# Altium footprint library Connectors.PcbLib: 14 footprints
Each footprint in its own frame and in the unit in brackets; x right, y up, seen from the top. Pads: shape width x height; smd on the part's side, far side on the other; paste and mask are expansions set on the pad; w line width, h text height; cw(c..) or ccw(c..) is an arc to the next point about the centre after c.
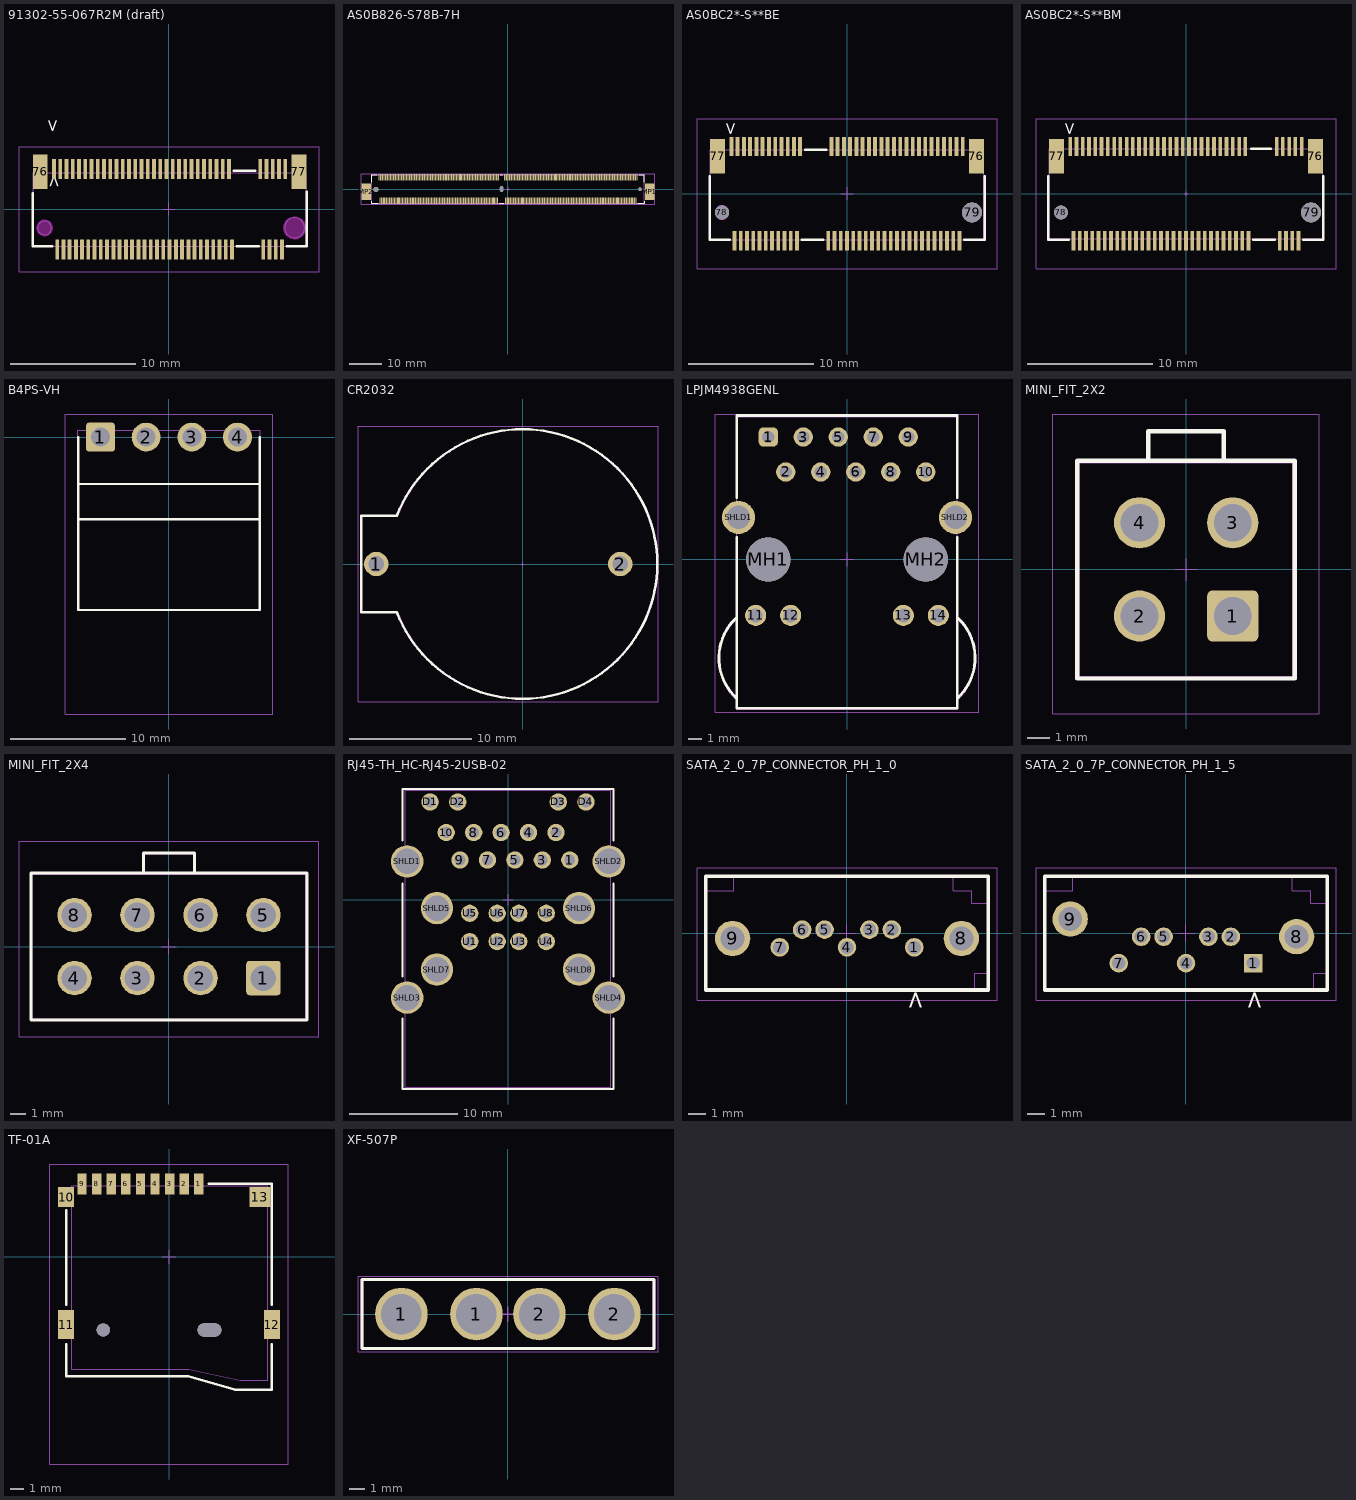
[diagram p0: the footprints below, top view; thin cyan lines are the x and y axes]

## 91302-55-067R2M (draft) [mil]
height 188.98
pads (69):
  rect 11.81x63 smd paste+0 mask+1.97: 1(-362.2,126.78) 2(-352.36,-127.16) 3(-342.52,126.78) 4(-332.67,-127.16) 5(-322.83,126.78) 6(-312.99,-127.16) 7(-303.15,126.78) 8(-293.3,-127.16) 9(-283.46,126.78) 10(-273.62,-127.16) 11(-263.78,126.78) 12(-253.94,-127.16) 13(-244.09,126.78) 14(-234.25,-127.16) 15(-224.41,126.78) 16(-214.57,-127.16) 17(-204.72,126.78) 18(-194.88,-127.16) 19(-185.04,126.78) 20(-175.19,-127.16) 21(-165.35,126.78) 22(-155.51,-127.16) 23(-145.67,126.78) 24(-135.82,-127.16) 25(-125.98,126.78) 26(-116.14,-127.16) 27(-106.3,126.78) 28(-96.45,-127.16) 29(-86.61,126.78) 30(-76.77,-127.16) 31(-66.93,126.78) 32(-57.09,-127.16) 33(-47.24,126.78) 34(-37.4,-127.16) 35(-27.56,126.78) 36(-17.72,-127.16) 37(-7.87,126.78) 38(1.97,-127.16) 39(11.81,126.78) 40(21.66,-127.16) 41(31.5,126.78) 42(41.34,-127.16) 43(51.18,126.78) 44(61.03,-127.16) 45(70.87,126.78) 46(80.71,-127.16) 47(90.55,126.78) 48(100.39,-127.16) 49(110.24,126.78) 50(120.08,-127.16) 51(129.92,126.78) 52(139.77,-127.16) 53(149.61,126.78) 54(159.45,-127.16) 55(169.29,126.78) 56(179.14,-127.16) 57(188.98,126.78) 58(198.82,-127.16) 67(297.24,-127.16) 68(287.4,126.78) 69(316.93,-127.16) 70(307.09,126.78) 71(336.61,-127.16) 72(326.77,126.78) 73(356.3,-127.16) 74(346.46,126.78) 75(366.14,126.78)
  rect 47.24x108.27 smd paste+0 mask+1.97: 76(-405.51,118.11) 77(409.45,118.11)
Top Overlay:
  lines w7.87: -428.74,49.81 -428.74,-117.12 -367.37,-117.12 ; 203.98,120.67 272.39,120.67 ; 213.82,-117.12 282.23,-117.12 ; 371.3,-117.12 433.46,-117.12 433.46,54.89
  text ">" at -383.84,284.46 h39.37
  text ">" at -344.49,65.94 h39.37
Keep-Out Layer:
  board cut-out: -370.08,-59.05 -370.08,-54.74 -373.38,-46.79 -379.47,-40.7 -387.43,-37.4 -396.04,-37.4 -404,-40.7 -410.09,-46.79 -413.38,-54.74 -413.38,-59.05 -413.38,-63.36 -410.09,-71.31 -404,-77.4 -396.04,-80.7 -387.43,-80.7 -379.47,-77.4 -373.38,-71.31 -370.08,-63.36
  board cut-out: 427.17,-59.05 427.17,-54.9 425.02,-46.89 420.87,-39.71 415.01,-33.84 407.83,-29.7 399.81,-27.55 391.52,-27.55 383.51,-29.7 376.33,-33.84 370.46,-39.71 366.31,-46.89 364.17,-54.9 364.17,-59.05 364.17,-63.2 366.31,-71.21 370.46,-78.39 376.33,-84.26 383.51,-88.4 391.52,-90.55 399.82,-90.55 407.83,-88.4 415.01,-84.26 420.87,-78.39 425.02,-71.21 427.17,-63.2
Keep-Out Layer:
  circle w10: c-391.73,-59.05 r21.65
  circle w1: c-391.73,-59.05 r21.65
  circle w10: c395.67,-59.05 r31.5
  circle w1: c395.67,-59.05 r31.5
Top Assembly:
  circle w1: c-391.73,-59.05 r21.65
  circle w1: c395.67,-59.05 r31.5
Top Courtyard:
  lines w1.97: -472.44,-196.85 472.45,-196.85 472.45,196.86 -472.44,196.86 -472.44,-196.85 ; -428.15,-117.12 432.09,-117.12 432.09,115.16 -428.15,115.16 -428.15,-117.12
Top Component Center:
  lines w1.97: -19.68,0 19.68,0 ; 0,-19.68 0,19.68
3D body "91302-55-067rde.stp": height 218.5, standoff -17.72, extent -430.12,-140.75 430.12,139.57

## AS0B826-S78B-7H [mm] "314pin MXM3.0 CONNECTOR"
height 7.8
pads (319):
  round 1.1 hole 1.1 unplated mask+0.05: MH1(41,-0.125)
  round 1.6 hole 1.6 unplated mask+0.05: MH2(-41,-0.125)
  oval 1x1.8 hole 1 slot 1.8 at 90 deg unplated mask+0.05: MH3(-2,0)
  rect 3x5.15 smd mask+0.05: MP1(44,-0.875) MP2(-44,-0.875)
  rect 0.35x2 smd mask+0.05: P1(-39.75,-3.625) P2(-39.25,-3.625) P3(-38.75,-3.625) P4(-38.25,-3.625) P5(-37.75,-3.625) P6(-37.25,-3.625) P7(-36.75,-3.625) P8(-36.25,-3.625) P9(-35.75,-3.625) P10(-35.25,-3.625) P11(-34.75,-3.625) P12(-34.25,-3.625) P13(-33.75,-3.625) P14(-33.25,-3.625) P15(-32.75,-3.625) P16(-32.25,-3.625) P17(-31.75,-3.625) P18(-31.25,-3.625) P19(-30.75,-3.625) P20(-30.25,-3.625) P21(-29.75,-3.625) P22(-29.25,-3.625) P23(-28.75,-3.625) P24(-28.25,-3.625) P25(-27.75,-3.625) P26(-27.25,-3.625) P27(-26.75,-3.625) P28(-26.25,-3.625) P29(-25.75,-3.625) P30(-25.25,-3.625) P31(-24.75,-3.625) P32(-24.25,-3.625) P33(-23.75,-3.625) P34(-23.25,-3.625) P35(-22.75,-3.625) P36(-22.25,-3.625) P37(-21.75,-3.625) P38(-21.25,-3.625) P39(-20.75,-3.625) P40(-20.25,-3.625) P41(-19.75,-3.625) P42(-19.25,-3.625) P43(-18.75,-3.625) P44(-18.25,-3.625) P45(-17.75,-3.625) P46(-17.25,-3.625) P47(-16.75,-3.625) P48(-16.25,-3.625) P49(-15.75,-3.625) P50(-15.25,-3.625) P51(-14.75,-3.625) P52(-14.25,-3.625) P53(-13.75,-3.625) P54(-13.25,-3.625) P55(-12.75,-3.625) P56(-12.25,-3.625) P57(-11.75,-3.625) P58(-11.25,-3.625) P59(-10.75,-3.625) P60(-10.25,-3.625) P61(-9.75,-3.625) P62(-9.25,-3.625) P63(-8.75,-3.625) P64(-8.25,-3.625) P65(-7.75,-3.625) P66(-7.25,-3.625) P67(-6.75,-3.625) P68(-6.25,-3.625) P69(-5.75,-3.625) P70(-5.25,-3.625) P71(-4.75,-3.625) P72(-4.25,-3.625) P73(-3.75,-3.625) P74(-3.25,-3.625) P75(-0.75,-3.625) P76(-0.25,-3.625) P77(0.25,-3.625) P78(0.75,-3.625) P79(1.25,-3.625) P80(1.75,-3.625) P81(2.25,-3.625) P82(2.75,-3.625) P83(3.25,-3.625) P84(3.75,-3.625) P85(4.25,-3.625) P86(4.75,-3.625) P87(5.25,-3.625) P88(5.75,-3.625) P89(6.25,-3.625) P90(6.75,-3.625) P91(7.25,-3.625) P92(7.75,-3.625) P93(8.25,-3.625) P94(8.75,-3.625) P95(9.25,-3.625) P96(9.75,-3.625) P97(10.25,-3.625) P98(10.75,-3.625) P99(11.25,-3.625) P100(11.75,-3.625) P101(12.25,-3.625) P102(12.75,-3.625) P103(13.25,-3.625) P104(13.75,-3.625) P105(14.25,-3.625) P106(14.75,-3.625) P107(15.25,-3.625) P108(15.75,-3.625) P109(16.25,-3.625) P110(16.75,-3.625) P111(17.25,-3.625) P112(17.75,-3.625) P113(18.25,-3.625) P114(18.75,-3.625) P115(19.25,-3.625) P116(19.75,-3.625) P117(20.25,-3.625) P118(20.75,-3.625) P119(21.25,-3.625) P120(21.75,-3.625) P121(22.25,-3.625) P122(22.75,-3.625) P123(23.25,-3.625) P124(23.75,-3.625) P125(24.25,-3.625) P126(24.75,-3.625) P127(25.25,-3.625) P128(25.75,-3.625) P129(26.25,-3.625) P130(26.75,-3.625) P131(27.25,-3.625) P132(27.75,-3.625) P133(28.25,-3.625) P134(28.75,-3.625) P135(29.25,-3.625) P136(29.75,-3.625) P137(30.25,-3.625) P138(30.75,-3.625) P139(31.25,-3.625) P140(31.75,-3.625) P141(32.25,-3.625) P142(32.75,-3.625) P143(33.25,-3.625) P144(33.75,-3.625) P145(34.25,-3.625) P146(34.75,-3.625) P147(35.25,-3.625) P148(35.75,-3.625) P149(36.25,-3.625) P150(36.75,-3.625) P151(37.25,-3.625) P152(37.75,-3.625) P153(38.25,-3.625) P154(38.75,-3.625) P155(39.25,-3.625) P156(39.75,-3.625) S1(-40,3.625) S2(-39.5,3.625) S3(-39,3.625) S4(-38.5,3.625) S5(-38,3.625) S6(-37.5,3.625) S7(-37,3.625) S8(-36.5,3.625) S9(-36,3.625) S10(-35.5,3.625) S11(-35,3.625) S12(-34.5,3.625) S13(-34,3.625) S14(-33.5,3.625) S15(-33,3.625) S16(-32.5,3.625) S17(-32,3.625) S18(-31.5,3.625) S19(-31,3.625) S20(-30.5,3.625) S21(-30,3.625) S22(-29.5,3.625) S23(-29,3.625) S24(-28.5,3.625) S25(-28,3.625) S26(-27.5,3.625) S27(-27,3.625) S28(-26.5,3.625) S29(-26,3.625) S30(-25.5,3.625) S31(-25,3.625) S32(-24.5,3.625) S33(-24,3.625) S34(-23.5,3.625) S35(-23,3.625) S36(-22.5,3.625) S37(-22,3.625) S38(-21.5,3.625) S39(-21,3.625) S40(-20.5,3.625) S41(-20,3.625) S42(-19.5,3.625) S43(-19,3.625) S44(-18.5,3.625) S45(-18,3.625) S46(-17.5,3.625) S47(-17,3.625) S48(-16.5,3.625) S49(-16,3.625) S50(-15.5,3.625) S51(-15,3.625) S52(-14.5,3.625) S53(-14,3.625) S54(-13.5,3.625) S55(-13,3.625) S56(-12.5,3.625) S57(-12,3.625) S58(-11.5,3.625) S59(-11,3.625) S60(-10.5,3.625) S61(-10,3.625) S62(-9.5,3.625) S63(-9,3.625) S64(-8.5,3.625) S65(-8,3.625) S66(-7.5,3.625) S67(-7,3.625) S68(-6.5,3.625) S69(-6,3.625) S70(-5.5,3.625) S71(-5,3.625) S72(-4.5,3.625) S73(-4,3.625) S74(-3.5,3.625) S75(-3,3.625) S76(-1,3.625) S77(-0.5,3.625) S78(0,3.625) S79(0.5,3.625) S80(1,3.625) S81(1.5,3.625) S82(2,3.625) S83(2.5,3.625) S84(3,3.625) S85(3.5,3.625) S86(4,3.625) S87(4.5,3.625) S88(5,3.625) S89(5.5,3.625) S90(6,3.625) S91(6.5,3.625) S92(7,3.625) S93(7.5,3.625) S94(8,3.625) S95(8.5,3.625) S96(9,3.625) S97(9.5,3.625) S98(10,3.625) S99(10.5,3.625) S100(11,3.625) S101(11.5,3.625) S102(12,3.625) S103(12.5,3.625) S104(13,3.625) S105(13.5,3.625) S106(14,3.625) S107(14.5,3.625) S108(15,3.625) S109(15.5,3.625) S110(16,3.625) S111(16.5,3.625) S112(17,3.625) S113(17.5,3.625) S114(18,3.625) S115(18.5,3.625) S116(19,3.625) S117(19.5,3.625) S118(20,3.625) S119(20.5,3.625) S120(21,3.625) S121(21.5,3.625) S122(22,3.625) S123(22.5,3.625) S124(23,3.625) S125(23.5,3.625) S126(24,3.625) S127(24.5,3.625) S128(25,3.625) S129(25.5,3.625) S130(26,3.625) S131(26.5,3.625) S132(27,3.625) S133(27.5,3.625) S134(28,3.625) S135(28.5,3.625) S136(29,3.625) S137(29.5,3.625) S138(30,3.625) S139(30.5,3.625) S140(31,3.625) S141(31.5,3.625) S142(32,3.625) S143(32.5,3.625) S144(33,3.625) S145(33.5,3.625) S146(34,3.625) S147(34.5,3.625) S148(35,3.625) S149(35.5,3.625) S150(36,3.625) S151(36.5,3.625) S152(37,3.625) S153(37.5,3.625) S154(38,3.625) S155(38.5,3.625) S156(39,3.625) S157(39.5,3.625) S158(40,3.625)
Top Overlay:
  lines w0.2: -42.3,-3.8 -42.3,-4.45 -40.31,-4.45 ; -42.3,2.05 -42.3,4.45 -40.56,4.45 ; -2.675,-4.45 -1.325,-4.45 ; -2.425,4.45 -1.575,4.45 ; 40.31,-4.45 42.3,-4.45 42.3,-3.8 ; 40.56,4.45 42.3,4.45 42.3,2.05
Top Assembly:
  lines w0.05: -42.3,-4.45 -42.3,4.45 42.3,4.45 42.3,-4.45 -42.3,-4.45
Top Courtyard:
  lines w0.05: -45.6,-4.725 45.6,-4.725 45.6,4.725 -45.6,4.725 -45.6,-4.725
Top Component Center:
  lines w0.05: -0.5,0 0.5,0 ; 0,-0.5 0,0.5
3D body "Foxconn_AS0B821-S78B-7H_AS0B826-S78B-7H_AS0B821-S78B-1H_AS0B826-S78B-1H_317-0000-1969_MXM_Socket.STEP": height 7.8, standoff -1.4, extent -44.4,-4.45 44.5,4.45

## AS0BC2*-S**BE [mm]
pads (71):
  rect 0.3x1.55 smd paste+0 mask+0.05: 1(-9.25,3.775) 2(-9,-3.775) 3(-8.75,3.775) 4(-8.5,-3.775) 5(-8.25,3.775) 6(-8,-3.775) 7(-7.75,3.775) 8(-7.5,-3.775) 9(-7.25,3.775) 10(-7,-3.775) 11(-6.75,3.775) 12(-6.5,-3.775) 13(-6.25,3.775) 14(-6,-3.775) 15(-5.75,3.775) 16(-5.5,-3.775) 17(-5.25,3.775) 18(-5,-3.775) 19(-4.75,3.775) 20(-4.5,-3.775) 21(-4.25,3.775) 22(-4,-3.775) 23(-3.75,3.775) 32(-1.5,-3.775) 33(-1.25,3.775) 34(-1,-3.775) 35(-0.75,3.775) 36(-0.5,-3.775) 37(-0.25,3.775) 38(0,-3.775) 39(0.25,3.775) 40(0.5,-3.775) 41(0.75,3.775) 42(1,-3.775) 43(1.25,3.775) 44(1.5,-3.775) 45(1.75,3.775) 46(2,-3.775) 47(2.25,3.775) 48(2.5,-3.775) 49(2.75,3.775) 50(3,-3.775) 51(3.25,3.775) 52(3.5,-3.775) 53(3.75,3.775) 54(4,-3.775) 55(4.25,3.775) 56(4.5,-3.775) 57(4.75,3.775) 58(5,-3.775) 59(5.25,3.775) 60(5.5,-3.775) 61(5.75,3.775) 62(6,-3.775) 63(6.25,3.775) 64(6.5,-3.775) 65(6.75,3.775) 66(7,-3.775) 67(7.25,3.775) 68(7.5,-3.775) 69(7.75,3.775) 70(8,-3.775) 71(8.25,3.775) 72(8.5,-3.775) 73(8.75,3.775) 74(9,-3.775) 75(9.25,3.775)
  rect 1.2x2.75 smd paste+0 mask+0.05: 76(10.35,3) 77(-10.35,3)
  round 1.1 hole 1.1 unplated mask+0.05: 78(-10,-1.5)
  round 1.6 hole 1.6 unplated mask+0.05: 79(10,-1.5)
Top Overlay:
  lines w0.2: -11,1.399 -11,-3.67 -9.381,-3.67 ; -3.619,-3.67 -1.881,-3.67 ; -3.35,3.525 -1.65,3.525 ; 9.381,-3.67 11,-3.67 11,1.399
  text ">" at -9.75,5.75 h1
Top Assembly:
  circle w0.025: c-10,-1.5 r0.55
  lines w0.05: -10.95,-3.67 10.95,-3.67 10.95,3.53 -10.95,3.53 -10.95,-3.67
Top Courtyard:
  lines w0.1: -12,-6 12,-6 12,6 -12,6 -12,-6
Top Component Center:
  lines w0.05: -0.5,0 0.5,0 ; 0,-0.5 0,0.5
3D body "91302-55-067rde.stp": height 5.45, standoff -0.55, extent -10.925,-3.35 10.925,3.77

## AS0BC2*-S**BM [mm]
pads (71):
  rect 0.3x1.55 smd paste+0 mask+0.05: 1(-9.25,3.775) 2(-9,-3.775) 3(-8.75,3.775) 4(-8.5,-3.775) 5(-8.25,3.775) 6(-8,-3.775) 7(-7.75,3.775) 8(-7.5,-3.775) 9(-7.25,3.775) 10(-7,-3.775) 11(-6.75,3.775) 12(-6.5,-3.775) 13(-6.25,3.775) 14(-6,-3.775) 15(-5.75,3.775) 16(-5.5,-3.775) 17(-5.25,3.775) 18(-5,-3.775) 19(-4.75,3.775) 20(-4.5,-3.775) 21(-4.25,3.775) 22(-4,-3.775) 23(-3.75,3.775) 24(-3.5,-3.775) 25(-3.25,3.775) 26(-3,-3.775) 27(-2.75,3.775) 28(-2.5,-3.775) 29(-2.25,3.775) 30(-2,-3.775) 31(-1.75,3.775) 32(-1.5,-3.775) 33(-1.25,3.775) 34(-1,-3.775) 35(-0.75,3.775) 36(-0.5,-3.775) 37(-0.25,3.775) 38(0,-3.775) 39(0.25,3.775) 40(0.5,-3.775) 41(0.75,3.775) 42(1,-3.775) 43(1.25,3.775) 44(1.5,-3.775) 45(1.75,3.775) 46(2,-3.775) 47(2.25,3.775) 48(2.5,-3.775) 49(2.75,3.775) 50(3,-3.775) 51(3.25,3.775) 52(3.5,-3.775) 53(3.75,3.775) 54(4,-3.775) 55(4.25,3.775) 56(4.5,-3.775) 57(4.75,3.775) 58(5,-3.775) 67(7.25,3.775) 68(7.5,-3.775) 69(7.75,3.775) 70(8,-3.775) 71(8.25,3.775) 72(8.5,-3.775) 73(8.75,3.775) 74(9,-3.775) 75(9.25,3.775)
  rect 1.2x2.75 smd paste+0 mask+0.05: 76(10.35,3) 77(-10.35,3)
  round 1.1 hole 1.1 unplated mask+0.05: 78(-10,-1.5)
  round 1.6 hole 1.6 unplated mask+0.05: 79(10,-1.5)
Top Overlay:
  lines w0.2: -11,1.399 -11,-3.67 -9.381,-3.67 ; 5.2,3.6 6.8,3.6 ; 5.381,-3.67 7.119,-3.67 ; 9.381,-3.67 11,-3.67 11,1.399
  text ">" at -9.75,5.75 h1
Top Assembly:
  lines w0.05: -10.95,-3.6 10.95,-3.6 10.95,3.6 -10.95,3.6 -10.95,-3.6
Top Courtyard:
  lines w0.1: -12,-6 12,-6 12,6 -12,6 -12,-6
Top Component Center:
  lines w0.05: -0.15,0 0.15,0 ; 0,-0.15 0,0.15
3D body "91302-42-067r2m.stp": height 3.95, standoff -0.75, extent -10.925,-4.3 10.925,4.103

## B4PS-VH [mm]
pads (4):
  rrect20% 2.5x2.5 hole 1.65 paste-2539.97 mask+0.05: 1(-5.94,0)
  round 2.5 hole 1.65 copper offset 0,0 paste-2539.97 mask+0.05: 2(-1.981,0) 3(1.98,0) 4(5.94,0)
Top Overlay:
  lines w0.2: -7.874,-7.112 7.874,-7.112 ; -7.874,-4.064 7.874,-4.064 ; -7.874,0 -7.874,-14.986 7.874,-14.986 7.874,0
Top Assembly:
  lines w0.05: -7.9,-15 -7.9,0.6 7.9,0.6 7.9,-15 -7.9,-15
Top Courtyard:
  lines w0.05: -9,-24 9,-24 9,2 -9,2 -9,-24
Top Component Center:
  lines w0.05: -0.15,0 0.15,0 ; 0,-0.15 0,0.15
3D body "B4PS-VH.stp": height 8.5, standoff -3.6, extent -7.89,-14.9 7.89,0.57

## CR2032 [mm] "KLS5-CR2032-01 (BH-642) (CH224-2032)"
pads (2):
  round 2 hole 1.3 mask+0.05: 1(-12,0) 2(8,0)
Top Overlay:
  lines w0.2: -10.321,-3.95 -13.25,-3.95 -13.25,3.95 -10.321,3.95 ; -10.321,-3.948 ccw(c0,0) -10.321,3.948
Top Assembly:
  lines w0.05: -13.2,-3.93 -10.274,-3.93 ccw(c0,0) -10.274,3.93 -13.2,3.93 -13.2,-3.93
Top Courtyard:
  lines w0.05: -13.5,-11.3 11.1,-11.3 11.1,11.3 -13.5,11.3 -13.5,-11.3
Top Component Center:
  lines w0.05: -0.15,0 0.15,0 ; 0,-0.15 0,0.15
3D body "BH-642.STEP": height 8.5, standoff -4.3, extent -13.3,-11.15 11,11.15

## LPJM4938GENL [mm] "2.5G Base-T RJ45 Jack With Magnetics Single Port Green/Yellow Led"
height 13.95
pads (18):
  rrect50% 1.4x1.4 hole 0.9 mask+0.05: 1(-5.715,8.89)
  round 1.4 hole 0.9 mask+0.05: 2(-4.445,6.35) 3(-3.175,8.89) 4(-1.905,6.35) 5(-0.635,8.89) 6(0.635,6.35) 7(1.905,8.89) 8(3.175,6.35) 9(4.445,8.89) 10(5.715,6.35)
  round 1.53 hole 1.02 mask+0.05: 11(-6.63,-4.06) 12(-4.09,-4.06) 13(4.09,-4.06) 14(6.63,-4.06)
  round 3.2 hole 3.2 unplated mask+0.05: MH1(-5.715,0) MH2(5.715,0)
  round 2.4 hole 1.7 mask+0.05: SHLD1(-7.875,3.05) SHLD2(7.875,3.05)
Top Overlay:
  lines w0.2: -8.099,-4.287 ccw(c-5.31,-7.14) -8.001,-10.086 ; -8,1.6 -8,-10.8 8,-10.8 8,1.6 ; -8,4.5 -8,10.45 8,10.45 8,4.5 ; 8.001,-10.086 ccw(c5.31,-7.14) 8.099,-4.287
Top Assembly:
  lines w0.05: -8,-10.89 8,-10.89 8,10.36 -8,10.36 -8,-10.89
  lines w0.1: -8.099,-4.377 ccw(c-5.31,-7.23) -8.001,-10.176 ; 8.001,-10.176 ccw(c5.31,-7.23) 8.099,-4.377
Top Courtyard:
  lines w0.05: -9.548,-11.09 -9.548,10.56 9.548,10.56 9.548,-11.09 -9.548,-11.09
Top Component Center:
  lines w0.05: -0.5,0 0.5,0 ; 0,-0.5 0,0.5
3D body "7499211121A.stp": height 14.9, standoff -3.55, extent -9.348,-10.89 9.348,10.36

## MINI_FIT_2X2 [mm]
height 13.1
pads (4):
  rrect20% 2.3x2.3 hole 1.7 paste-2539.97 mask+0.05: 1(2.1,-2.1)
  round 2.3 hole 1.7 paste-2539.97 mask+0.05: 2(-2.1,-2.1) 3(2.1,2.1) 4(-2.1,2.1)
Top Overlay:
  lines w0.2: -1.7,4.9 -1.7,6.229 1.7,6.229 1.7,4.9 ; -4.913,-4.913 4.9,-4.913 4.9,4.9 -4.913,4.9 -4.913,-4.913
Top Assembly:
  lines w0.05: -1.7,4.8 -1.7,6.2 1.7,6.2 1.7,4.8 ; -4.813,-4.813 4.8,-4.813 4.8,4.8 -4.813,4.8 -4.813,-4.813
Top Courtyard:
  lines w0.05: -6.013,-6.513 6,-6.513 6,7 -6.013,7 -6.013,-6.513
Top Component Center:
  lines w0.05: -0.5,0 0.5,0 ; 0,-0.5 0,0.5
3D body "User Library-Con_MF-04MA.STEP": height 12.8, standoff -3.5, extent -4.8,-4.8 5.197,6.2

## MINI_FIT_2X4 [mm]
height 13.1
pads (8):
  rrect20% 2.3x2.3 hole 1.7 paste-2539.97 mask+0.05: 1(6.3,-2.1)
  round 2.3 hole 1.7 paste-2539.97 mask+0.05: 2(2.1,-2.1) 3(-2.1,-2.1) 4(-6.3,-2.1) 5(6.3,2.1) 6(2.1,2.1) 7(-2.1,2.1) 8(-6.3,2.1)
Top Overlay:
  lines w0.2: -1.7,4.9 -1.7,6.229 1.7,6.229 1.7,4.9 ; -9.2,-4.9 9.2,-4.9 9.2,4.9 -9.2,4.9 -9.2,-4.9
Top Assembly:
  lines w0.05: -1.7,4.8 -1.7,6.2 1.7,6.2 1.7,4.8 ; -9.1,-4.8 9.1,-4.8 9.1,4.8 -9.1,4.8 -9.1,-4.8
Top Courtyard:
  lines w0.05: -10,-6 10,-6 10,7 -10,7 -10,-6
Top Component Center:
  lines w0.05: -0.5,0 0.5,0 ; 0,-0.5 0,0.5
3D body "User Library-Con_MF-08MA.STEP": height 12.8, standoff -3.5, extent -9.1,-4.8 9.297,6.2

## RJ45-TH_HC-RJ45-2USB-02 [mm]
height 30.65
pads (30):
  round 1.6 hole 1 paste-2539.97 mask+0.05: 1(5.715,3.68) 2(4.445,6.22) 3(3.175,3.68) 4(1.905,6.22) 5(0.635,3.68) 6(-0.635,6.22) 7(-1.905,3.68) 8(-3.175,6.22) 9(-4.445,3.68) 10(-5.715,6.22) D1(-7.205,9.05) D2(-4.65,9.05) D3(4.65,9.05) D4(7.205,9.05) U1(-3.54,-3.87) U2(-1,-3.87) U3(1,-3.87) U4(3.54,-3.87) U5(-3.54,-1.25) U6(-1,-1.25) U7(1,-1.25) U8(3.54,-1.25)
  round 3 hole 2.35 paste-2539.97 mask+0.05: SHLD1(-9.325,3.55) SHLD2(9.325,3.55) SHLD3(-9.325,-9.05) SHLD4(9.325,-9.05) SHLD5(-6.57,-0.77) SHLD6(6.57,-0.77) SHLD7(-6.57,-6.45) SHLD8(6.57,-6.45)
Top Overlay:
  lines w0.2: -9.75,-11 -9.75,-17.5 9.75,-17.5 9.75,-11 ; -9.75,-7.1 -9.75,1.5 ; -9.75,5.5 -9.75,10.25 9.75,10.25 9.75,5.5 ; 9.75,-7.1 9.75,1.5
Top Assembly:
  lines w0.05: -9.525,-17.35 9.525,-17.35 9.525,10.15 -9.525,10.15 -9.525,-17.35
Top Component Center:
  lines w0.05: -0.5,0 0.5,0 ; 0,-0.5 0,0.5
3D body "usb.STEP": height 31, standoff -4, extent -9.625,-17.4 9.625,10.1

## SATA_2_0_7P_CONNECTOR_PH_1_0 [mm]
height 8.5
pads (9):
  round 1.05 hole 0.74 mask+0.05: 1(3.81,-0.805) 2(2.54,0.195) 3(1.27,0.195) 4(0,-0.805) 5(-1.27,0.195) 6(-2.54,0.195) 7(-3.81,-0.805)
  round 2 hole 1.35 mask+0.05: 8(6.48,-0.305) 9(-6.48,-0.305)
Top Overlay:
  lines w0.2: -8,3.195 -7.97,3.225 8,3.225 8,-3.225 -8,-3.225 -8,3.225
  text ">" at 4.31,-4.365 h1
Top Assembly:
  lines w0.05: -6.418,3.225 6.024,3.225 6.024,2.408 7.072,2.408 7.072,1.698 8,1.698 8,-2.272 7.251,-2.272 7.251,-3.225 -8,-3.225 ; -6.418,3.226 -6.419,2.406 -8,2.406 -8,-3.225 ; -8,-3.225 -8,3.225 8,3.225 8,-3.225 -8,-3.225
Top Courtyard:
  lines w0.05: -8.5,-3.805 8.5,-3.805 8.5,3.695 -8.5,3.695 -8.5,-3.805
Top Component Center:
  lines w0.05: -0.5,0 0.5,0 ; 0,-0.5 0,0.5
3D body "sata-501-m07s1by-a_step.stp": height 9, standoff -2.4, extent -8,-3.225 8,3.225

## SATA_2_0_7P_CONNECTOR_PH_1_5 [mm]
height 8.5
pads (9):
  rect 1.05x1.05 hole 0.74 mask+0.05: 1(3.81,-1.705)
  round 1.05 hole 0.74 mask+0.05: 2(2.54,-0.205) 3(1.27,-0.205) 4(0,-1.705) 5(-1.27,-0.205) 6(-2.54,-0.205) 7(-3.81,-1.705)
  round 2 hole 1.35 mask+0.05: 8(6.27,-0.205) 9(-6.56,0.795)
Top Overlay:
  lines w0.2: -8,3.195 -7.97,3.225 8,3.225 8,-3.225 -8,-3.225 -8,3.225
  text ">" at 4.31,-4.365 h1
Top Assembly:
  lines w0.05: -6.418,3.225 6.024,3.225 6.024,2.408 7.072,2.408 7.072,1.698 8,1.698 8,-2.272 7.251,-2.272 7.251,-3.225 -8,-3.225 ; -6.418,3.226 -6.419,2.406 -8,2.406 -8,-3.225 ; -8,-3.225 8,-3.225 8,3.225 -8,3.225 -8,-3.225
Top Courtyard:
  lines w0.05: -8.5,-3.805 -8.5,3.695 8.5,3.695 8.5,-3.805 -8.5,-3.805
Top Component Center:
  lines w0.05: -0.5,0 0.5,0 ; 0,-0.5 0,0.5
3D body "sata-501-m07s1by-a_step.stp": height 9, standoff -2.4, extent -8,-3.225 8,3.225

## TF-01A [mm]
pads (15):
  rect 0.7x1.6 smd mask+0.05: 1(2.25,5.5) 2(1.15,5.5) 3(0.05,5.5) 4(-1.05,5.5) 5(-2.15,5.5) 6(-3.25,5.5) 7(-4.35,5.5) 8(-5.45,5.5) 9(-6.55,5.5)
  rect 1.2x1.5 smd mask+0.05: 10(-7.75,4.5)
  rect 1.2x2.2 smd mask+0.05: 11(-7.75,-5.1) 12(7.75,-5.1)
  rect 1.6x1.5 smd mask+0.05: 13(6.85,4.5)
  round 1 hole 1 unplated mask+0.05: POS_HOLE(-4.95,-5.5)
  oval 1.8x1 hole 1 slot 1.8 at 0 deg unplated mask+0.05: POS_HOLE(3.05,-5.5)
Top Overlay:
  lines w0.2: -7.75,-6.6 -7.75,-9 1.45,-9 5,-10 7.75,-10 7.75,-6.6 ; -7.75,-3.6 -7.75,3.5 ; 3,5.5 7.75,5.5 7.75,-3.6
Top Assembly:
  lines w0.05: -7.325,-8.475 -7.325,5.35 7.425,5.35 7.425,-9.275 5.375,-9.275 1.475,-8.475 -7.325,-8.475
Top Courtyard:
  lines w0.05: -9,-15.6 -9,7 9,7 9,-15.6 -9,-15.6
Top Component Center:
  lines w0.05: -0.5,0 0.5,0 ; 0,-0.5 0,0.5
3D body "TF-01A.step": height 2.05, standoff -0.35, extent -7.98,-12.071 8.12,5.75

## XF-507P [mm] "ATO Blade Fuse Holder"
pads (4):
  round 3.5 hole 2.7 mask+0.05: 1(-7.1,0) 1(-2.1,0) 2(2.1,0) 2(7.1,0)
Top Overlay:
  lines w0.2: -9.75,-2.3 -9.75,2.3 9.75,2.3 9.75,-2.3 -9.75,-2.3
Top Assembly:
  lines w0.2: -9.75,-2.3 -9.75,2.3 9.75,2.3 9.75,-2.3 -9.75,-2.3
Top Courtyard:
  lines w0.05: -10,-2.5 -10,2.5 10,2.5 10,-2.5 -10,-2.5
Top Component Center:
  lines w0.1: -0.5,0 0.5,0 ; 0,-0.5 0,0.5
3D body "3A ATM FUSE, PURPLE.STEP": height 20.81, standoff 2.01, extent -9.525,-2.54 9.525,2.54
3D body "Gnizdo bezpiecznika samochodowego.SLDPRT": height 7.8, standoff -3.25, extent -9.85,-2.25 9.85,2.25